# Altium footprint library ICs.PcbLib: 163 footprints (part 11 of 11)
Each footprint in its own frame and in the unit in brackets; x right, y up, seen from the top. Pads: shape width x height; smd on the part's side, far side on the other; paste and mask are expansions set on the pad; w line width, h text height; cw(c..) or ccw(c..) is an arc to the next point about the centre after c.
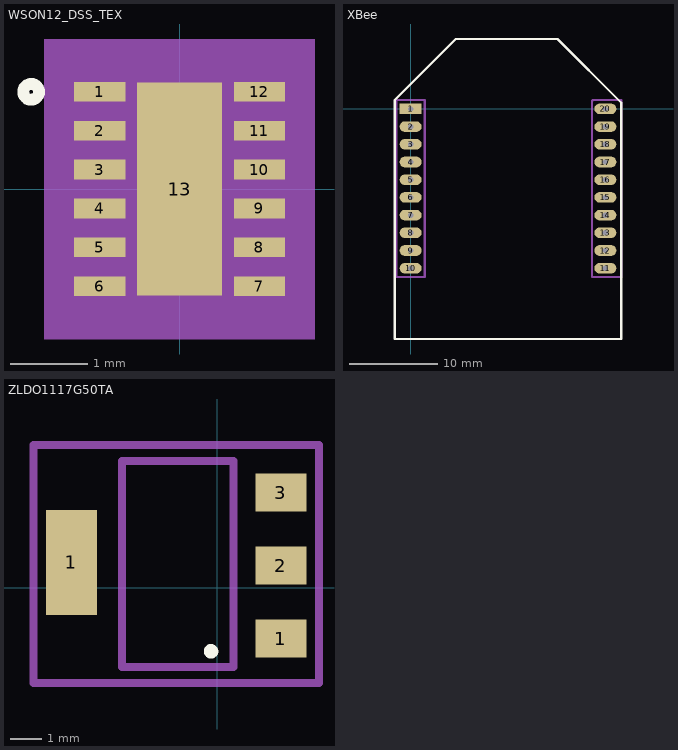
[diagram p10: the footprints below, top view; thin cyan lines are the x and y axes]

## WSON12_DSS_TEX [mil]
pads (13):
  rect 26x10 smd paste+0 mask+0: 1(-40.5,49.23) 2(-40.5,29.54) 3(-40.5,9.85) 4(-40.5,-9.85) 5(-40.5,-29.54) 6(-40.5,-49.23) 7(40.5,-49.23) 8(40.5,-29.54) 9(40.5,-9.85) 10(40.5,9.85) 11(40.5,29.54) 12(40.5,49.23)
  rect 43x108 smd paste+0 mask+0: 13(0,0)
Top Overlay:
  circle w6: c-75.19,49.23 r4
Top Paste:
  region: 17.56,-3.94 -17.56,-3.94 -17.56,-50.06 17.56,-50.06
  region: 17.56,50.06 -17.56,50.06 -17.56,3.94 17.56,3.94
Mechanical 5:
  region: 68.5,-76 -68.5,-76 -68.5,76 68.5,76
Mechanical 13:
  circle w0: c-27.5,49.23 r3
  lines w0: -12,61 ccw(c0,61) 12,61
  lines w1: -41.5,-61 -41.5,61 41.5,61 41.5,-61 -41.5,-61
Mechanical 15:
  region: -51.5,-64.22 -63.5,-64.22 -63.5,64.22 -51.5,64.22 -51.5,71 51.5,71 51.5,64.22 63.5,64.22 63.5,-64.22 51.5,-64.22 51.5,-71 -51.5,-71
  lines w6: -63.5,-64.22 -51.5,-64.22 -51.5,-71 51.5,-71 51.5,-64.22 63.5,-64.22 63.5,64.22 51.5,64.22 51.5,71 -51.5,71 -51.5,64.22 -63.5,64.22 -63.5,-64.22
3D body "WSON12_DSS_TEX.step": height 32.09, standoff 0, extent -41.5,-60.98 41.5,60.98

## XBee [mm]
pads (20):
  rect 2.5x1.2 hole 0.6: 1(0,0)
  oval 2.5x1.2 hole 0.6: 2(0,-2) 3(0,-4) 4(0,-6) 5(0,-8) 6(0,-10) 7(0,-12) 8(0,-14) 9(0,-16) 10(0,-18) 11(22,-18) 12(22,-16) 13(22,-14) 14(22,-12) 15(22,-10) 16(22,-8) 17(22,-6) 18(22,-4) 19(22,-2) 20(22,0)
Top Overlay:
  lines w0.254: 23.3,-26 23.8,-26 ; 23.8,-26 23.8,-18.7 23.8,0.7 ; 23.8,-26 -1.8,-26 -1.8,-25.6 -1.8,-18.6 -1.8,0.7 -1.8,1 5.1,7.9 16.6,7.9 23.8,0.7 ; 23.8,0.7 23.8,0.7
Mechanical 1:
  lines w0.254: -1.6,-19 1.6,-19 1.6,1 -1.5,1 -1.6,1.1 -1.6,-19 ; 20.5,-19 20.5,0.9 20.6,1 23.8,1 23.8,-19 20.5,-19
3D body: height 4, standoff 0, extent 20.5,-19 23.8,1
3D body: height 4, standoff 0, extent -1.9,-19 1.6,1
3D body: height 4.06, standoff 2.8, extent -1.9,-26 23.8,8

## ZLDO1117G50TA [mm]
height 1.6
pads (4):
  rect 1.6x3.3 smd: 1(-4.6,0.8)
  rect 1.6x1.2 smd: 1(2,-1.6) 2(2,0.7) 3(2,3)
Top Overlay:
  circle w0.254: c-0.2,-2 r0.1
Mechanical 13:
  lines w0.254: -3,-2.5 0.5,-2.5 0.5,4 -3,4 -3,-2.5
Mechanical 15:
  lines w0.254: 3.1,-3 -5.8,-3 -5.8,4.5 3.1,4.5 ; 3.2,-3 3.2,4.5
3D body: height 1.6, standoff 0, extent -3.1,-2.6 0.6,4.1